# Altium footprint library fszhang.PcbLib: 1032 footprints (part 37 of 66)
Each footprint in its own frame and in the unit in brackets; x right, y up, seen from the top. Pads: shape width x height; smd on the part's side, far side on the other; paste and mask are expansions set on the pad; w line width, h text height; cw(c..) or ccw(c..) is an arc to the next point about the centre after c.
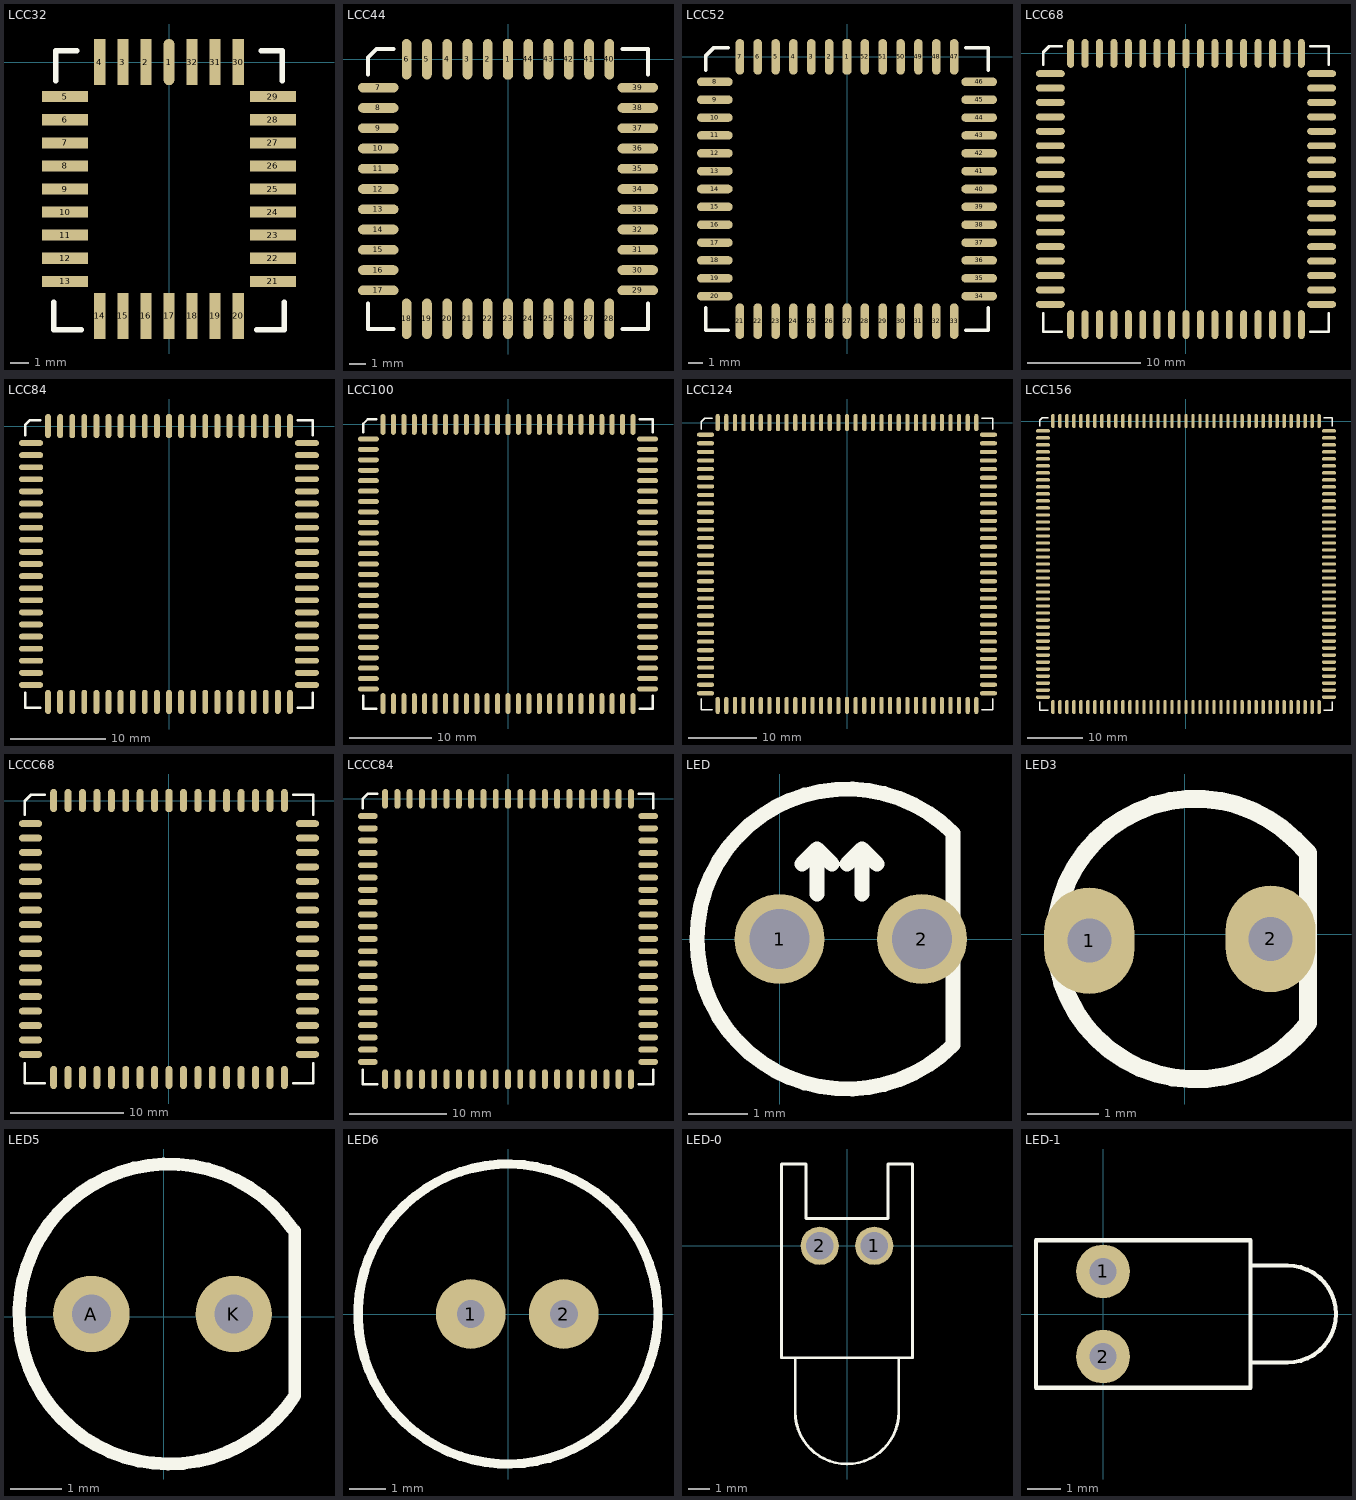
[diagram p36: the footprints below, top view; thin cyan lines are the x and y axes]

## LCC32 [mil]
pads (32):
  oval 24x100 smd: 1(0,0)
  rect 24x100 smd: 2(-50,0) 3(-100,0) 4(-150,0) 14(-150,-550) 15(-100,-550) 16(-50,-550) 17(0,-550) 18(50,-550) 19(100,-550) 20(150,-550) 30(150,0) 31(100,0) 32(50,0)
  rect 100x24 smd: 5(-225,-75) 6(-225,-125) 7(-225,-175) 8(-225,-225) 9(-225,-275) 10(-225,-325) 11(-225,-375) 12(-225,-425) 13(-225,-475) 21(225,-475) 22(225,-425) 23(225,-375) 24(225,-325) 25(225,-275) 26(225,-225) 27(225,-175) 28(225,-125) 29(225,-75)
Top Overlay:
  lines w12: -250,-520 -250,-580 -190,-580 ; -245,-40 -245,25 -200,25 ; 190,-580 250,-580 250,-520 ; 200,25 245,25 245,-40

## LCC44 [mil]
pads (44):
  oct 24x100 smd: 1(0,0)
  oval 24x100 smd: 2(-50,0) 3(-100,0) 4(-150,0) 5(-200,0) 6(-250,0) 18(-250,-640) 19(-200,-640) 20(-150,-640) 21(-100,-640) 22(-50,-640) 23(0,-640) 24(50,-640) 25(100,-640) 26(150,-640) 27(200,-640) 28(250,-640) 40(250,0) 41(200,0) 42(150,0) 43(100,0) 44(50,0)
  oval 100x24 smd: 7(-320,-70) 8(-320,-120) 9(-320,-170) 10(-320,-220) 11(-320,-270) 12(-320,-320) 13(-320,-370) 14(-320,-420) 15(-320,-470) 16(-320,-520) 17(-320,-570) 29(320,-570) 30(320,-520) 31(320,-470) 32(320,-420) 33(320,-370) 34(320,-320) 35(320,-270) 36(320,-220) 37(320,-170) 38(320,-120) 39(320,-70)
Top Overlay:
  lines w10: -345,-602 -345,-665 -282,-665 ; -345,-38 -345,4 -324,25 -282,25 ; 282,-665 345,-665 345,-602 ; 282,25 345,25 345,-38

## LCC52 [mil]
pads (52):
  oct 24x100 smd: 1(0,0)
  oval 24x100 smd: 2(-50,0) 3(-100,0) 4(-150,0) 5(-200,0) 6(-250,0) 7(-300,0) 21(-300,-740) 22(-250,-740) 23(-200,-740) 24(-150,-740) 25(-100,-740) 26(-50,-740) 27(0,-740) 28(50,-740) 29(100,-740) 30(150,-740) 31(200,-740) 32(250,-740) 33(300,-740) 47(300,0) 48(250,0) 49(200,0) 50(150,0) 51(100,0) 52(50,0)
  oval 100x24 smd: 8(-370,-70) 9(-370,-120) 10(-370,-170) 11(-370,-220) 12(-370,-270) 13(-370,-320) 14(-370,-370) 15(-370,-420) 16(-370,-470) 17(-370,-520) 18(-370,-570) 19(-370,-620) 20(-370,-670) 34(370,-670) 35(370,-620) 36(370,-570) 37(370,-520) 38(370,-470) 39(370,-420) 40(370,-370) 41(370,-320) 42(370,-270) 43(370,-220) 44(370,-170) 45(370,-120) 46(370,-70)
Top Overlay:
  lines w10: -395,-702 -395,-765 -332,-765 ; -395,-38 -395,4 -374,25 -332,25 ; 332,-765 395,-765 395,-702 ; 332,25 395,25 395,-38

## LCC68 [mil]
pads (68):
  oct 24x100 smd: 1(0,0)
  oval 24x100 smd: 2(-50,0) 3(-100,0) 4(-150,0) 5(-200,0) 6(-250,0) 7(-300,0) 8(-350,0) 9(-400,0) 27(-400,-940) 28(-350,-940) 29(-300,-940) 30(-250,-940) 31(-200,-940) 32(-150,-940) 33(-100,-940) 34(-50,-940) 35(0,-940) 36(50,-940) 37(100,-940) 38(150,-940) 39(200,-940) 40(250,-940) 41(300,-940) 42(350,-940) 43(400,-940) 61(400,0) 62(350,0) 63(300,0) 64(250,0) 65(200,0) 66(150,0) 67(100,0) 68(50,0)
  oval 100x24 smd: 10(-470,-70) 11(-470,-120) 12(-470,-170) 13(-470,-220) 14(-470,-270) 15(-470,-320) 16(-470,-370) 17(-470,-420) 18(-470,-470) 19(-470,-520) 20(-470,-570) 21(-470,-620) 22(-470,-670) 23(-470,-720) 24(-470,-770) 25(-470,-820) 26(-470,-870) 44(470,-870) 45(470,-820) 46(470,-770) 47(470,-720) 48(470,-670) 49(470,-620) 50(470,-570) 51(470,-520) 52(470,-470) 53(470,-420) 54(470,-370) 55(470,-320) 56(470,-270) 57(470,-220) 58(470,-170) 59(470,-120) 60(470,-70)
Top Overlay:
  lines w10: -495,-902 -495,-965 -432,-965 ; -495,-38 -495,4 -474,25 -432,25 ; 432,-965 495,-965 495,-902 ; 432,25 495,25 495,-38

## LCC84 [mil]
pads (84):
  oct 24x100 smd: 1(0,0)
  oval 24x100 smd: 2(-50,0) 3(-100,0) 4(-150,0) 5(-200,0) 6(-250,0) 7(-300,0) 8(-350,0) 9(-400,0) 10(-450,0) 11(-500,0) 33(-500,-1140) 34(-450,-1140) 35(-400,-1140) 36(-350,-1140) 37(-300,-1140) 38(-250,-1140) 39(-200,-1140) 40(-150,-1140) 41(-100,-1140) 42(-50,-1140) 43(0,-1140) 44(50,-1140) 45(100,-1140) 46(150,-1140) 47(200,-1140) 48(250,-1140) 49(300,-1140) 50(350,-1140) 51(400,-1140) 52(450,-1140) 53(500,-1140) 75(500,0) 76(450,0) 77(400,0) 78(350,0) 79(300,0) 80(250,0) 81(200,0) 82(150,0) 83(100,0) 84(50,0)
  oval 100x24 smd: 12(-570,-70) 13(-570,-120) 14(-570,-170) 15(-570,-220) 16(-570,-270) 17(-570,-320) 18(-570,-370) 19(-570,-420) 20(-570,-470) 21(-570,-520) 22(-570,-570) 23(-570,-620) 24(-570,-670) 25(-570,-720) 26(-570,-770) 27(-570,-820) 28(-570,-870) 29(-570,-920) 30(-570,-970) 31(-570,-1020) 32(-570,-1070) 54(570,-1070) 55(570,-1020) 56(570,-970) 57(570,-920) 58(570,-870) 59(570,-820) 60(570,-770) 61(570,-720) 62(570,-670) 63(570,-620) 64(570,-570) 65(570,-520) 66(570,-470) 67(570,-420) 68(570,-370) 69(570,-320) 70(570,-270) 71(570,-220) 72(570,-170) 73(570,-120) 74(570,-70)
Top Overlay:
  lines w10: -595,-1102 -595,-1165 -532,-1165 ; -595,-38 -595,4 -574,25 -532,25 ; 532,-1165 595,-1165 595,-1102 ; 532,25 595,25 595,-38

## LCC100 [mil]
pads (100):
  oct 24x100 smd: 1(0,0)
  oval 24x100 smd: 2(-50,0) 3(-100,0) 4(-150,0) 5(-200,0) 6(-250,0) 7(-300,0) 8(-350,0) 9(-400,0) 10(-450,0) 11(-500,0) 12(-550,0) 13(-600,0) 39(-600,-1340) 40(-550,-1340) 41(-500,-1340) 42(-450,-1340) 43(-400,-1340) 44(-350,-1340) 45(-300,-1340) 46(-250,-1340) 47(-200,-1340) 48(-150,-1340) 49(-100,-1340) 50(-50,-1340) 51(0,-1340) 52(50,-1340) 53(100,-1340) 54(150,-1340) 55(200,-1340) 56(250,-1340) 57(300,-1340) 58(350,-1340) 59(400,-1340) 60(450,-1340) 61(500,-1340) 62(550,-1340) 63(600,-1340) 89(600,0) 90(550,0) 91(500,0) 92(450,0) 93(400,0) 94(350,0) 95(300,0) 96(250,0) 97(200,0) 98(150,0) 99(100,0) 100(50,0)
  oval 100x24 smd: 14(-670,-70) 15(-670,-120) 16(-670,-170) 17(-670,-220) 18(-670,-270) 19(-670,-320) 20(-670,-370) 21(-670,-420) 22(-670,-470) 23(-670,-520) 24(-670,-570) 25(-670,-620) 26(-670,-670) 27(-670,-720) 28(-670,-770) 29(-670,-820) 30(-670,-870) 31(-670,-920) 32(-670,-970) 33(-670,-1020) 34(-670,-1070) 35(-670,-1120) 36(-670,-1170) 37(-670,-1220) 38(-670,-1270) 64(670,-1270) 65(670,-1220) 66(670,-1170) 67(670,-1120) 68(670,-1070) 69(670,-1020) 70(670,-970) 71(670,-920) 72(670,-870) 73(670,-820) 74(670,-770) 75(670,-720) 76(670,-670) 77(670,-620) 78(670,-570) 79(670,-520) 80(670,-470) 81(670,-420) 82(670,-370) 83(670,-320) 84(670,-270) 85(670,-220) 86(670,-170) 87(670,-120) 88(670,-70)
Top Overlay:
  lines w10: -695,-1302 -695,-1365 -632,-1365 ; -695,-38 -695,4 -674,25 -632,25 ; 632,-1365 695,-1365 695,-1302 ; 632,25 695,25 695,-38

## LCC124 [mil]
pads (124):
  oct 24x100 smd: 1(0,0)
  oval 24x100 smd: 2(-50,0) 3(-100,0) 4(-150,0) 5(-200,0) 6(-250,0) 7(-300,0) 8(-350,0) 9(-400,0) 10(-450,0) 11(-500,0) 12(-550,0) 13(-600,0) 14(-650,0) 15(-700,0) 16(-750,0) 48(-750,-1640) 49(-700,-1640) 50(-650,-1640) 51(-600,-1640) 52(-550,-1640) 53(-500,-1640) 54(-450,-1640) 55(-400,-1640) 56(-350,-1640) 57(-300,-1640) 58(-250,-1640) 59(-200,-1640) 60(-150,-1640) 61(-100,-1640) 62(-50,-1640) 63(0,-1640) 64(50,-1640) 65(100,-1640) 66(150,-1640) 67(200,-1640) 68(250,-1640) 69(300,-1640) 70(350,-1640) 71(400,-1640) 72(450,-1640) 73(500,-1640) 74(550,-1640) 75(600,-1640) 76(650,-1640) 77(700,-1640) 78(750,-1640) 110(750,0) 111(700,0) 112(650,0) 113(600,0) 114(550,0) 115(500,0) 116(450,0) 117(400,0) 118(350,0) 119(300,0) 120(250,0) 121(200,0) 122(150,0) 123(100,0) 124(50,0)
  oval 100x24 smd: 17(-820,-70) 18(-820,-120) 19(-820,-170) 20(-820,-220) 21(-820,-270) 22(-820,-320) 23(-820,-370) 24(-820,-420) 25(-820,-470) 26(-820,-520) 27(-820,-570) 28(-820,-620) 29(-820,-670) 30(-820,-720) 31(-820,-770) 32(-820,-820) 33(-820,-870) 34(-820,-920) 35(-820,-970) 36(-820,-1020) 37(-820,-1070) 38(-820,-1120) 39(-820,-1170) 40(-820,-1220) 41(-820,-1270) 42(-820,-1320) 43(-820,-1370) 44(-820,-1420) 45(-820,-1470) 46(-820,-1520) 47(-820,-1570) 79(820,-1570) 80(820,-1520) 81(820,-1470) 82(820,-1420) 83(820,-1370) 84(820,-1320) 85(820,-1270) 86(820,-1220) 87(820,-1170) 88(820,-1120) 89(820,-1070) 90(820,-1020) 91(820,-970) 92(820,-920) 93(820,-870) 94(820,-820) 95(820,-770) 96(820,-720) 97(820,-670) 98(820,-620) 99(820,-570) 100(820,-520) 101(820,-470) 102(820,-420) 103(820,-370) 104(820,-320) 105(820,-270) 106(820,-220) 107(820,-170) 108(820,-120) 109(820,-70)
Top Overlay:
  lines w10: -845,-1602 -845,-1665 -782,-1665 ; -845,-38 -845,4 -824,25 -782,25 ; 782,-1665 845,-1665 845,-1602 ; 782,25 845,25 845,-38

## LCC156 [mil]
pads (156):
  oct 24x100 smd: 1(0,0)
  oval 24x100 smd: 2(-50,0) 3(-100,0) 4(-150,0) 5(-200,0) 6(-250,0) 7(-300,0) 8(-350,0) 9(-400,0) 10(-450,0) 11(-500,0) 12(-550,0) 13(-600,0) 14(-650,0) 15(-700,0) 16(-750,0) 17(-800,0) 18(-850,0) 19(-900,0) 20(-950,0) 60(-950,-2040) 61(-900,-2040) 62(-850,-2040) 63(-800,-2040) 64(-750,-2040) 65(-700,-2040) 66(-650,-2040) 67(-600,-2040) 68(-550,-2040) 69(-500,-2040) 70(-450,-2040) 71(-400,-2040) 72(-350,-2040) 73(-300,-2040) 74(-250,-2040) 75(-200,-2040) 76(-150,-2040) 77(-100,-2040) 78(-50,-2040) 79(0,-2040) 80(50,-2040) 81(100,-2040) 82(150,-2040) 83(200,-2040) 84(250,-2040) 85(300,-2040) 86(350,-2040) 87(400,-2040) 88(450,-2040) 89(500,-2040) 90(550,-2040) 91(600,-2040) 92(650,-2040) 93(700,-2040) 94(750,-2040) 95(800,-2040) 96(850,-2040) 97(900,-2040) 98(950,-2040) 138(950,0) 139(900,0) 140(850,0) 141(800,0) 142(750,0) 143(700,0) 144(650,0) 145(600,0) 146(550,0) 147(500,0) 148(450,0) 149(400,0) 150(350,0) 151(300,0) 152(250,0) 153(200,0) 154(150,0) 155(100,0) 156(50,0)
  oval 100x24 smd: 21(-1020,-70) 22(-1020,-120) 23(-1020,-170) 24(-1020,-220) 25(-1020,-270) 26(-1020,-320) 27(-1020,-370) 28(-1020,-420) 29(-1020,-470) 30(-1020,-520) 31(-1020,-570) 32(-1020,-620) 33(-1020,-670) 34(-1020,-720) 35(-1020,-770) 36(-1020,-820) 37(-1020,-870) 38(-1020,-920) 39(-1020,-970) 40(-1020,-1020) 41(-1020,-1070) 42(-1020,-1120) 43(-1020,-1170) 44(-1020,-1220) 45(-1020,-1270) 46(-1020,-1320) 47(-1020,-1370) 48(-1020,-1420) 49(-1020,-1470) 50(-1020,-1520) 51(-1020,-1570) 52(-1020,-1620) 53(-1020,-1670) 54(-1020,-1720) 55(-1020,-1770) 56(-1020,-1820) 57(-1020,-1870) 58(-1020,-1920) 59(-1020,-1970) 99(1020,-1970) 100(1020,-1920) 101(1020,-1870) 102(1020,-1820) 103(1020,-1770) 104(1020,-1720) 105(1020,-1670) 106(1020,-1620) 107(1020,-1570) 108(1020,-1520) 109(1020,-1470) 110(1020,-1420) 111(1020,-1370) 112(1020,-1320) 113(1020,-1270) 114(1020,-1220) 115(1020,-1170) 116(1020,-1120) 117(1020,-1070) 118(1020,-1020) 119(1020,-970) 120(1020,-920) 121(1020,-870) 122(1020,-820) 123(1020,-770) 124(1020,-720) 125(1020,-670) 126(1020,-620) 127(1020,-570) 128(1020,-520) 129(1020,-470) 130(1020,-420) 131(1020,-370) 132(1020,-320) 133(1020,-270) 134(1020,-220) 135(1020,-170) 136(1020,-120) 137(1020,-70)
Top Overlay:
  lines w10: -1045,-2002 -1045,-2065 -982,-2065 ; -1045,-38 -1045,4 -1024,25 -982,25 ; 982,-2065 1045,-2065 1045,-2002 ; 982,25 1045,25 1045,-38

## LCCC68 [mil]
pads (68):
  oct 24x80 smd: 1(0,0)
  oval 24x80 smd: 2(-50,0) 3(-100,0) 4(-150,0) 5(-200,0) 6(-250,0) 7(-300,0) 8(-350,0) 9(-400,0) 27(-400,-960) 28(-350,-960) 29(-300,-960) 30(-250,-960) 31(-200,-960) 32(-150,-960) 33(-100,-960) 34(-50,-960) 35(0,-960) 36(50,-960) 37(100,-960) 38(150,-960) 39(200,-960) 40(250,-960) 41(300,-960) 42(350,-960) 43(400,-960) 61(400,0) 62(350,0) 63(300,0) 64(250,0) 65(200,0) 66(150,0) 67(100,0) 68(50,0)
  oval 80x24 smd: 10(-480,-80) 11(-480,-130) 12(-480,-180) 13(-480,-230) 14(-480,-280) 15(-480,-330) 16(-480,-380) 17(-480,-430) 18(-480,-480) 19(-480,-530) 20(-480,-580) 21(-480,-630) 22(-480,-680) 23(-480,-730) 24(-480,-780) 25(-480,-830) 26(-480,-880) 44(480,-880) 45(480,-830) 46(480,-780) 47(480,-730) 48(480,-680) 49(480,-630) 50(480,-580) 51(480,-530) 52(480,-480) 53(480,-430) 54(480,-380) 55(480,-330) 56(480,-280) 57(480,-230) 58(480,-180) 59(480,-130) 60(480,-80)
Top Overlay:
  lines w10: -500,-912 -500,-980 -432,-980 ; -500,-48 -500,-2 -478,20 -432,20 ; 432,-980 500,-980 500,-912 ; 432,20 500,20 500,-48

## LCCC84 [mil]
pads (84):
  oct 24x80 smd: 1(0,0)
  oval 24x80 smd: 2(-50,0) 3(-100,0) 4(-150,0) 5(-200,0) 6(-250,0) 7(-300,0) 8(-350,0) 9(-400,0) 10(-450,0) 11(-500,0) 33(-500,-1140) 34(-450,-1140) 35(-400,-1140) 36(-350,-1140) 37(-300,-1140) 38(-250,-1140) 39(-200,-1140) 40(-150,-1140) 41(-100,-1140) 42(-50,-1140) 43(0,-1140) 44(50,-1140) 45(100,-1140) 46(150,-1140) 47(200,-1140) 48(250,-1140) 49(300,-1140) 50(350,-1140) 51(400,-1140) 52(450,-1140) 53(500,-1140) 75(500,0) 76(450,0) 77(400,0) 78(350,0) 79(300,0) 80(250,0) 81(200,0) 82(150,0) 83(100,0) 84(50,0)
  oval 80x24 smd: 12(-570,-70) 13(-570,-120) 14(-570,-170) 15(-570,-220) 16(-570,-270) 17(-570,-320) 18(-570,-370) 19(-570,-420) 20(-570,-470) 21(-570,-520) 22(-570,-570) 23(-570,-620) 24(-570,-670) 25(-570,-720) 26(-570,-770) 27(-570,-820) 28(-570,-870) 29(-570,-920) 30(-570,-970) 31(-570,-1020) 32(-570,-1070) 54(570,-1070) 55(570,-1020) 56(570,-970) 57(570,-920) 58(570,-870) 59(570,-820) 60(570,-770) 61(570,-720) 62(570,-670) 63(570,-620) 64(570,-570) 65(570,-520) 66(570,-470) 67(570,-420) 68(570,-370) 69(570,-320) 70(570,-270) 71(570,-220) 72(570,-170) 73(570,-120) 74(570,-70)
Top Overlay:
  lines w10: -590,-1102 -590,-1160 -532,-1160 ; -590,-38 -590,1 -571,20 -532,20 ; 532,-1160 590,-1160 590,-1102 ; 532,20 590,20 590,-38

## LED [mil]
pads (2):
  round 60 hole 40: 1(0,0) 2(95,0)
Top Overlay:
  lines w10: 15,50 25,60 ; 25,30 25,60 ; 35,50 25,60 ; 45,50 55,60 ; 55,30 55,60 ; 65,50 55,60 ; 115.71,-70.71 cw(c45,0) 115.71,70.71 115.71,-70.71

## LED3 [mil]
pads (2):
  oval 50x59.05 hole 24.41: 1(-53,-3.5) 2(47.5,-2.5)
Top Overlay:
  lines w10: 60.96,52.46 ccw(c5.96,-2.54) 68.18,-49.21 68.18,45.23 60.96,52.46

## LED5 [mm]
pads (2):
  round 1.5 hole 0.762: A(-1.416,0.054) K(1.378,0.054)
Top Overlay:
  lines w0.254: 2.525,1.738 ccw(c0.108,0.054) 2.578,-1.551 2.578,1.685

## LED6 [mil]
pads (2):
  round 75 hole 30: 1(-40,0) 2(60,0)
Top Overlay:
  circle w10: c0,0 r161.25

## LED-0 [mil] "Typical INFRARED GaAs LED; 2 Leads"
pads (2):
  round 70 hole 50: 1(50,0) 2(-50,0)
Top Overlay:
  lines w5: -95,-205 -95,-305 ccw(c0,-305) 95,-305 95,-205 ; -120,-205 120,-205 120,150 75,150 75,50 -75,50 -75,150 -120,150 -120,-205

## LED-1 [mm] "Typical RED GaAs LED; 2 Leads"
pads (2):
  round 1.6 hole 0.8: 1(0,1.27) 2(0,-1.27)
Top Overlay:
  lines w0.127: 4.4,-1.45 5.5,-1.45 ccw(c5.5,0) 5.5,1.45 4.4,1.45 ; -2,-2.2 4.4,-2.2 4.4,2.2 -2,2.2 -2,-2.2